# Altium footprint library custom.PcbLib: 305 footprints (part 16 of 20)
Each footprint in its own frame and in the unit in brackets; x right, y up, seen from the top. Pads: shape width x height; smd on the part's side, far side on the other; paste and mask are expansions set on the pad; w line width, h text height; cw(c..) or ccw(c..) is an arc to the next point about the centre after c.
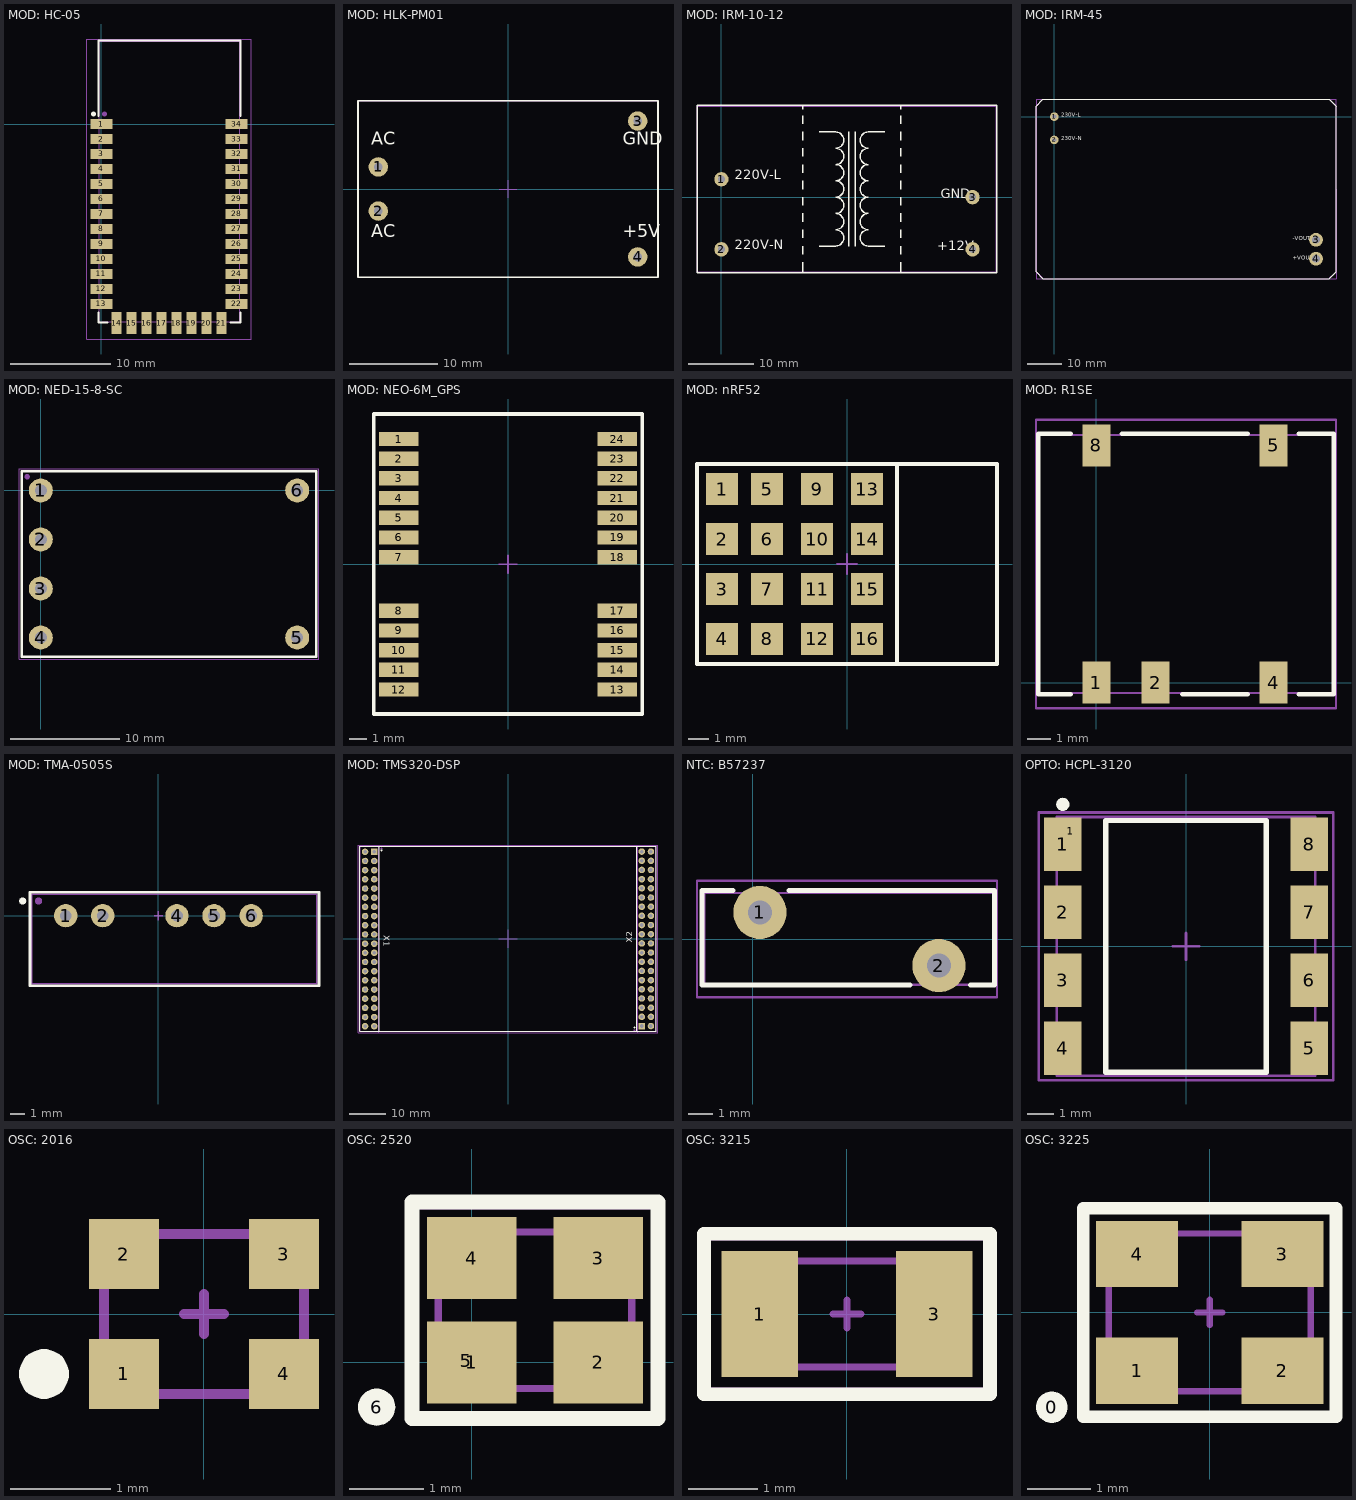
[diagram p15: the footprints below, top view; thin cyan lines are the x and y axes]

## MOD: HC-05 [mm] "Bluetooth 2.0 module"
height 2
pads (36):
  rect 2.2x1 smd: 1(0,0) 2(0,-1.5) 3(0,-3) 4(0,-4.5) 5(0,-6) 6(0,-7.5) 7(0,-9) 8(0,-10.5) 9(0,-12) 10(0,-13.5) 11(0,-15) 12(0,-16.5) 13(0,-18) 22(13.5,-18) 23(13.5,-16.5) 24(13.5,-15) 25(13.5,-13.5) 26(13.5,-12) 27(13.5,-10.5) 28(13.5,-9) 29(13.5,-7.5) 30(13.5,-6) 31(13.5,-4.5) 32(13.5,-3) 33(13.5,-1.5) 34(13.5,0)
  rect 1x2.2 smd: 14(1.5,-19.9) 15(3,-19.9) 16(4.5,-19.9) 17(6,-19.9) 18(7.5,-19.9) 19(9,-19.9) 20(10.5,-19.9) 21(12,-19.9)
  round 0.5 on Mech1: 33(0.3,1)
  round 0.5 on Top Overlay: 34(-0.8,1)
Top Overlay:
  lines w0.2: -0.3,-18.875 -0.3,-19.85 0.625,-19.85 ; -0.3,0.8 -0.3,8.35 13.9,8.35 13.9,0.8 ; 12.875,-19.85 13.9,-19.85 13.9,-18.875
Top Assy:
  lines w0.1: -0.21,-19.76 13.81,-19.76 13.81,8.25 -0.21,8.25 -0.21,-19.76
Size Area:
  lines w0.1: -1.5,-21.5 -1.5,8.5 15,8.5 15,-21.5 -1.5,-21.5
3D body "HC-05.step": height 2.35, standoff 0, extent -0.21,-19.76 13.81,8.25

## MOD: HLK-PM01 [mm]
height 15
pads (4):
  round 2.2 hole 1: 1(-14.7,2.5) 2(-14.7,-2.5) 3(14.7,7.7) 4(14.7,-7.7)
Top Overlay:
  lines w0.2: -17,-10 0,-10 17,-10 17,10 -17,10 -17,-10
  text "AC" at -15.5,4.5 h2.5
  text "AC" at -15.5,-6 h2.5
  text "+5V" at 13,-6 h2.5
  text "GND" at 13,4.5 h2.5
Top Assy:
  lines w0.1: -17,-10 -17,10 17,10 17,-10 -17,-10
Size Area:
  lines w0.1: -1,0 1,0 ; 0,-1 0,1 ; -17,-10 -17,10 17,10 17,-10 -17,-10
3D body "HLK-PM01.STEP": height 15.03, standoff -4.99, extent -17,-10.1 17,10.1

## MOD: IRM-10-12 [mm]
pads (4):
  round 2.2 hole 1.1: 1(0,2.75) 2(0,-8) 3(38.5,0) 4(38.5,-8)
Top Overlay:
  lines w0.2: 12.5,-11.5 12.5,-10 ; 12.5,-8.75 12.5,-7.5 ; 12.5,-6.25 12.5,-5 ; 12.5,-3.75 12.5,-2.5 ; 12.5,-1.25 12.5,0 ; 12.5,1.25 12.5,2.5 ; 12.5,3.75 12.5,5 ; 12.5,6.25 12.5,7.5 ; 12.5,8.75 12.5,10 ; 12.5,11.25 12.5,12.5 ; 12.5,13.5 12.5,14 ; 15,-7.5 17.5,-7.5 ccw(c17.5,-6.25) 17.5,-5 ccw(c17.5,-3.75) 17.5,-2.5 ccw(c17.5,-1.25) 17.5,0 ccw(c17.5,1.25) 17.5,2.5 ccw(c17.5,3.75) 17.5,5 ccw(c17.5,6.25) 17.5,7.5 ccw(c17.5,8.75) 17.5,10 15,10 ; 19.5,-7.5 19.5,10 ; 20.5,-7.5 20.5,10 ; 25,-7.5 22.5,-7.5 cw(c22.5,-6.25) 22.5,-5 cw(c22.5,-3.75) 22.5,-2.5 cw(c22.5,-1.25) 22.5,0 cw(c22.5,1.25) 22.5,2.5 cw(c22.5,3.75) 22.5,5 cw(c22.5,6.25) 22.5,7.5 cw(c22.5,8.75) 22.5,10 25,10 ; 27.5,-11.5 27.5,-10 ; 27.5,-8.75 27.5,-7.5 ; 27.5,-6.25 27.5,-5 ; 27.5,-3.75 27.5,-2.5 ; 27.5,-1.25 27.5,0 ; 27.5,1.25 27.5,2.5 ; 27.5,3.75 27.5,5 ; 27.5,6.25 27.5,7.5 ; 27.5,8.75 27.5,10 ; 27.5,11.25 27.5,12.5 ; 27.5,13.5 27.5,14 ; -3.75,-11.6 -3.75,14.1 42.25,14.1 42.25,-11.6 -3.75,-11.6
  text "GND" at 33.6,-0.7 h2.5
  text "+12V" at 33.1,-8.7 h2.5
  text "220V-L" at 2,2.2 h2.5
  text "220V-N" at 2,-8.5 h2.5
Top Assy:
  lines w0.1: -3.6,-11.45 42.099,-11.45 42.099,13.95 -3.6,13.95 -3.6,-11.45
Size Area:
  lines w0.1: -3.7,-11.55 -3.7,14.05 42.2,14.05 42.2,-11.55 -3.7,-11.55
3D body "User Library-IRM-10-12.STEP": height 22.05, standoff -3.5, extent -3.6,-11.45 42.099,13.95

## MOD: IRM-45 [mm]
pads (4):
  round 2.5 hole 1.2: 1(0,0) 2(0,-6.75)
  round 4 hole 2.2: 3(76,-35.75) 4(76,-41.25)
Top Overlay:
  lines w0.2: -5.3,3 -5.3,3 ; -5.3,3 -3.3,5 79.8,5 81.8,3 81.8,-45.05 79.8,-47.05 -3.3,-47.05 -5.3,-45.05 -5.3,3
  text "230V-N" at 2,-7.25 h2
  text "230V-L" at 2,-0.5 h2
  text "+VOUT" at 69.25,-42 h2
  text "-VOUT" at 69.25,-36.25 h2
Top Assy:
  lines w0.1: -5.3,-45.05 -5.3,3 -3.3,5 79.8,5 81.8,3 81.8,-45.05 79.75,-47.1 -3.25,-47.1 -5.3,-45.05
  text "230V-L" at 2,-0.5 h2
  text "230V-N" at 2,-7.25 h2
  text "+VOUT" at 69.25,-42 h2
  text "-VOUT" at 69.25,-36.25 h2
Size Area:
  lines w0.1: -5.3,-47.1 81.8,-47.1 81.8,5.1 -5.3,5.1 -5.3,-47.1
3D body "IRM-45-15.step": height 29.51, standoff -3.5, extent -5.25,-47 81.75,5

## MOD: NED-15-8-SC [mm]
pads (7):
  round 2.2 hole 1.1: 1(0,0) 2(0,-4.5) 3(0,-9) 4(0,-13.5) 5(23.5,-13.5) 6(23.5,0)
  round 0.5 on Mech1: ""(-1.25,1.25)
Top Overlay:
  lines w0.2: -1.75,-15.25 25.25,-15.25 25.25,1.75 -1.75,1.75 -1.75,-15.25
Top Assy:
  lines w0.1: -1.75,-15.25 -1.75,1.75 25.25,1.75 25.25,-15.25 -1.75,-15.25
Size Area:
  lines w0.1: -2,-15.5 25.5,-15.5 25.5,2 -2,2 -2,-15.5
3D body "PCB for isolatorPcbDoc.step": height 8.2, standoff -3.57, extent -1.75,-15.25 25.25,1.75

## MOD: NEO-6M_GPS [mm]
height 2
pads (24):
  rect 2.2x0.8 smd: 1(-6.1,7) 2(-6.1,5.9) 3(-6.1,4.8) 4(-6.1,3.7) 5(-6.1,2.6) 6(-6.1,1.5) 7(-6.1,0.4) 8(-6.1,-2.6) 9(-6.1,-3.7) 10(-6.1,-4.8) 11(-6.1,-5.9) 12(-6.1,-7) 13(6.1,-7) 14(6.1,-5.9) 15(6.1,-4.8) 16(6.1,-3.7) 17(6.1,-2.6) 18(6.1,0.4) 19(6.1,1.5) 20(6.1,2.6) 21(6.1,3.7) 22(6.1,4.8) 23(6.1,5.9) 24(6.1,7)
Top Overlay:
  lines w0.2: -7.497,-8.367 -7.497,8.397 7.489,8.397 7.489,-8.367 -7.497,-8.367
Top Assy:
  lines w0.1: -7.497,-8.367 7.489,-8.367 7.489,8.397 -7.497,8.397 -7.497,-8.367
Size Area:
  lines w0.1: -0.5,0 0.5,0 ; 0,-0.5 0,0.5 ; -7.497,-8.367 -7.497,8.397 7.489,8.397 7.489,-8.367 -7.497,-8.367
3D body "UBLOX_GPS_NEO-6M.step": height 2.64, standoff 0, extent -6.184,-8.31 6.176,8.29

## MOD: nRF52 [mm]
pads (16):
  rect 1.6x1.6 smd: 1(-6.25,3.75) 2(-6.25,1.25) 3(-6.25,-1.25) 4(-6.25,-3.75) 5(-4,3.75) 6(-4,1.25) 7(-4,-1.25) 8(-4,-3.75) 9(-1.5,3.75) 10(-1.5,1.25) 11(-1.5,-1.25) 12(-1.5,-3.75) 13(1,3.75) 14(1,1.25) 15(1,-1.25) 16(1,-3.75)
Top Overlay:
  lines w0.2: 2.5,-5 2.5,5 ; -7.5,-5 -7.5,5 7.5,5 7.5,-5 -7.5,-5
Top Assy:
  lines w0.1: -7.5,-5 7.5,-5 7.5,5 -7.5,5 -7.5,-5
Size Area:
  lines w0.1: -0.5,0 0.5,0 ; 0,-0.5 0,0.5 ; -7.5,-5 7.5,-5 7.5,5 -7.5,5 -7.5,-5

## MOD: R1SE [mm]
pads (5):
  rect 1.2x1.8 smd: 1(0,0) 2(2.54,0) 4(7.62,0) 5(7.62,10.2) 8(0,10.2)
Top Overlay:
  lines w0.2: -1.1,-0.5 -2.5,-0.5 -2.5,10.7 -1.1,10.7 ; 1.1,10.7 6.5,10.7 ; 3.7,-0.5 6.5,-0.5 ; 8.7,-0.5 10.2,-0.5 10.2,10.7 8.7,10.7
Top Assy:
  lines w0.1: -2.525,-0.45 -2.525,10.65 10.225,10.65 10.225,-0.45 -2.525,-0.45
Size Area:
  lines w0.1: -2.6,-1.1 10.3,-1.1 10.3,11.3 -2.6,11.3 -2.6,-1.1
3D body "User Library-RECOM_R1S-xxxx.STEP": height 7, standoff 0, extent -2.525,-0.45 10.225,10.65

## MOD: TMA-0505S [mm]
pads (7):
  round 1.6 hole 0.8: 1(-6.35,0) 2(-3.81,0) 4(1.27,0) 5(3.81,0) 6(6.35,0)
  round 0.5 on Top Overlay: ""(-9.3,1)
  round 0.5 on Mech1: ""(-8.21,1)
Top Overlay:
  lines w0.2: -8.8,-4.8 11,-4.8 11,1.6 -8.8,1.6 -8.8,-4.8
Top Assy:
  lines w0.1: -8.66,-4.67 -8.66,1.45 10.84,1.45 10.84,-4.67 -8.66,-4.67
Size Area:
  lines w0.1: -0.3,0 0.3,0 ; 0,-0.3 0,0.3 ; -8.8,-4.8 11,-4.8 11,1.6 -8.8,1.6 -8.8,-4.8
3D body "User Library-Traco TMA 0505S.STEP": height 10.2, standoff -3.2, extent -8.66,-4.67 10.84,1.45

## MOD: TMS320-DSP [mm]
pads (84):
  rect 1.8x1.8 hole 1: 1(-37.005,24.1) 41(37.005,-24.1)
  round 1.8 hole 1: 2(-39.545,24.1) 3(-37.005,21.56) 4(-39.545,21.56) 5(-37.005,19.02) 6(-39.545,19.02) 7(-37.005,16.48) 8(-39.545,16.48) 9(-37.005,13.94) 10(-39.545,13.94) 11(-37.005,11.4) 12(-39.545,11.4) 13(-37.005,8.86) 14(-39.545,8.86) 15(-37.005,6.32) 16(-39.545,6.32) 17(-37.005,3.78) 18(-39.545,3.78) 19(-37.005,1.24) 20(-39.545,1.24) 21(-37.005,-1.3) 22(-39.545,-1.3) 23(-37.005,-3.84) 24(-39.545,-3.84) 25(-37.005,-6.38) 26(-39.545,-6.38) 27(-37.005,-8.92) 28(-39.545,-8.92) 29(-37.005,-11.46) 30(-39.545,-11.46) 31(-37.005,-14) 32(-39.545,-14) 33(-37.005,-16.54) 34(-39.545,-16.54) 35(-37.005,-19.08) 36(-39.545,-19.08) 37(-37.005,-21.62) 38(-39.545,-21.62) 39(-37.005,-24.16) 40(-39.545,-24.16) 42(39.545,-24.1) 43(37.005,-21.56) 44(39.545,-21.56) 45(37.005,-19.02) 46(39.545,-19.02) 47(37.005,-16.48) 48(39.545,-16.48) 49(37.005,-13.94) 50(39.545,-13.94) 51(37.005,-11.4) 52(39.545,-11.4) 53(37.005,-8.86) 54(39.545,-8.86) 55(37.005,-6.32) 56(39.545,-6.32) 57(37.005,-3.78) 58(39.545,-3.78) 59(37.005,-1.24) 60(39.545,-1.24) 61(37.005,1.3) 62(39.545,1.3) 63(37.005,3.84) 64(39.545,3.84) 65(37.005,6.38) 66(39.545,6.38) 67(37.005,8.92) 68(39.545,8.92) 69(37.005,11.46) 70(39.545,11.46) 71(37.005,14) 72(39.545,14) 73(37.005,16.54) 74(39.545,16.54) 75(37.005,19.08) 76(39.545,19.08) 77(37.005,21.62) 78(39.545,21.62) 79(37.005,24.16) 80(39.545,24.16)
  round 0.5 on Top Overlay: ""(-35,24.5) ""(35,-24.5)
  round 0.5 on Mech1: ""(-35,25) ""(35,-25.25)
Top Overlay:
  lines w0.2: -35.6,-25.6 -35.6,25.6 ; 35.6,-25.507 35.6,25.6 ; -41,-25.6 -41,25.6 41,25.6 41,-25.5 -41,-25.6
  text "X2" at 35,-1 h3
  text "X1" at -35,1 h3
Top Assy:
  lines w0.1: -35.72,-26 -35.72,25.9 ; 35.75,-25.945 35.75,25.95 ; -41.5,-26.002 41.5,-25.941 41.5,25.96 -41.5,25.899 -41.5,-26.002
Size Area:
  lines w0.1: -2.5,0 2.5,0 ; 0,-2.5 0,2.5 ; -40.9,-25.5 -40.9,25.5 40.9,25.6 40.9,-25.4 -40.9,-25.5
3D body "PCB for DSP control.step": height 21.14, standoff 2.51, extent -41.5,-26.05 41.5,25.95
3D body "User Library-PLS-10.STEP": height 8.54, standoff -3, extent 35.75,0.06 38.29,25.46
3D body "User Library-PLS-10.STEP": height 8.54, standoff -3, extent 38.29,0.06 40.83,25.46
3D body "User Library-PLS-10.STEP": height 8.54, standoff -3, extent 35.75,-25.34 38.29,0.06
3D body "User Library-PLS-10.STEP": height 8.54, standoff -3, extent 38.29,-25.34 40.83,0.06
3D body "User Library-PLS-10.STEP": height 8.54, standoff -3, extent -38.26,-25.4 -35.72,0
3D body "User Library-PLS-10.STEP": height 8.54, standoff -3, extent -40.8,-25.4 -38.26,0
3D body "User Library-PLS-10.STEP": height 8.54, standoff -3, extent -38.26,0 -35.72,25.4
3D body "User Library-PLS-10.STEP": height 8.54, standoff -3, extent -40.8,0 -38.26,25.4

## NTC: B57237 [mm]
pads (2):
  round 2.2 hole 1: 1(0.3,1.1) 2(7.7,-1.1)
Top Overlay:
  lines w0.2: -0.8,2 -2.1,2 -2.1,-1.9 6.5,-1.9 ; 1.5,2 10,2 10,-1.9 9,-1.9
Top Assy:
  lines w0.1: -2,-1.9 -2,1.902 10,1.902 10,-1.9 -2,-1.9
Size Area:
  lines w0.1: -2.3,-2.4 10.1,-2.4 10.1,2.4 -2.3,2.4 -2.3,-2.4
3D body "User Library-S10K275.STEP": height 13, standoff -2.5, extent -2,-1.9 10,1.902

## OPTO: HCPL-3120 [mm]
pads (10):
  rect 1.4x2 smd: 1(-4.6,3.81) 2(-4.6,1.27) 3(-4.6,-1.27) 4(-4.6,-3.81) 5(4.6,-3.81) 6(4.6,-1.27) 7(4.6,1.27) 8(4.6,3.81)
  round 0.5 on Mech1: 1(-4.3,4.3)
  round 0.5 on Top Overlay: ""(-4.6,5.3)
Top Overlay:
  lines w0.2: -3,-4.7 3,-4.7 3,4.7 -3,4.7 -3,-4.7
Top Assy:
  lines w0.1: -4.83,-4.83 4.83,-4.83 4.83,4.83 -4.83,4.83 -4.83,-4.83
Size Area:
  lines w0.1: -0.5,0 0.5,0 ; 0,-0.5 0,0.5 ; -5.5,-5 5.5,-5 5.5,5 -5.5,5 -5.5,-5
3D body "User Library-HCPL-3120-300.STEP": height 4.79, standoff 0, extent -4.83,-4.83 4.83,4.83

## OSC: 2016 [mm]
pads (5):
  rect 0.7x0.7 smd: 1(-0.8,-0.6) 2(-0.8,0.6) 3(0.8,0.6) 4(0.8,-0.6)
  round 0.5 on Top Overlay: ""(-1.6,-0.6)
Top Assy:
  lines w0.1: -1,-0.8 -1,0.8 1,0.8 1,-0.8 -1,-0.8
Size Area:
  lines w0.1: -0.2,0 0.2,0 ; 0,-0.2 0,0.2 ; -1,-0.8 -1,0.8 1,0.8 1,-0.8 -1,-0.8
3D body "User Library-XRCGB27M000F2P00R0.STEP": height 0.65, standoff 0, extent -1,-0.8 1,0.8

## OSC: 2520 [mm]
pads (6):
  rect 1.2x1.1 smd: 1(0,0) 2(1.7,0) 3(1.7,1.4) 4(0,1.4)
  round 0.5 on Mech1: 5(-0.075,0.025)
  round 0.5 on Top Overlay: 6(-1.275,-0.6)
Top Overlay:
  lines w0.2: -0.8,-0.75 2.5,-0.75 2.5,2.15 -0.8,2.15 -0.8,-0.75
Top Assy:
  lines w0.1: -0.45,-0.35 -0.45,1.75 2.15,1.75 2.15,-0.35 -0.45,-0.35
Size Area:
  lines w0.1: -0.8,-0.7 -0.8,2.1 2.5,2.1 2.5,-0.7 -0.8,-0.7
3D body "User Library-Crystal NDK NX2520SA series.STEP": height 0.55, standoff 0, extent -0.45,-0.35 2.15,1.75

## OSC: 3215 [mm]
pads (2):
  rect 1.1x1.8 smd: 1(-1.25,0) 3(1.25,0)
Top Overlay:
  lines w0.2: -2.05,-1.15 2.05,-1.15 2.05,1.15 -2.05,1.15 -2.05,-1.15
Top Assy:
  lines w0.1: -1.61,-0.76 -1.61,0.76 1.61,0.76 1.61,-0.76 -1.61,-0.76
Size Area:
  lines w0.1: -0.2,0 0.2,0 ; 0,-0.2 0,0.2 ; -2.05,-1.1 2.05,-1.1 2.05,1.1 -2.05,1.1 -2.05,-1.1
3D body "User Library-ABS07.STEP": height 0.91, standoff 0, extent -1.61,-0.76 1.61,0.76

## OSC: 3225 [mm]
height 0.55
pads (5):
  round 0.5 on Top Overlay: 0(-2.5,-1.5)
  rect 1.3x1.05 smd: 1(-1.15,-0.925) 2(1.15,-0.925) 3(1.15,0.925) 4(-1.15,0.925)
Top Overlay:
  lines w0.2: -2,-1.65 2,-1.65 2,1.65 -2,1.65 -2,-1.65
Top Assy:
  lines w0.1: -1.6,-1.25 -1.6,1.25 1.6,1.25 1.6,-1.25 -1.6,-1.25
Size Area:
  lines w0.1: -0.2,0 0.2,0 ; 0,-0.2 0,0.2 ; -2,-1.7 -2,1.7 2,1.7 2,1.6 2,-1.7 -2,-1.7
3D body "User Library-User Library-Siward_SX3225.step": height 0.81, standoff 0, extent -1.6,-1.25 1.6,1.25